# Altium footprint library PcbLib_jp.PcbLib: 255 footprints (part 9 of 16)
Each footprint in its own frame and in the unit in brackets; x right, y up, seen from the top. Pads: shape width x height; smd on the part's side, far side on the other; paste and mask are expansions set on the pad; w line width, h text height; cw(c..) or ccw(c..) is an arc to the next point about the centre after c.
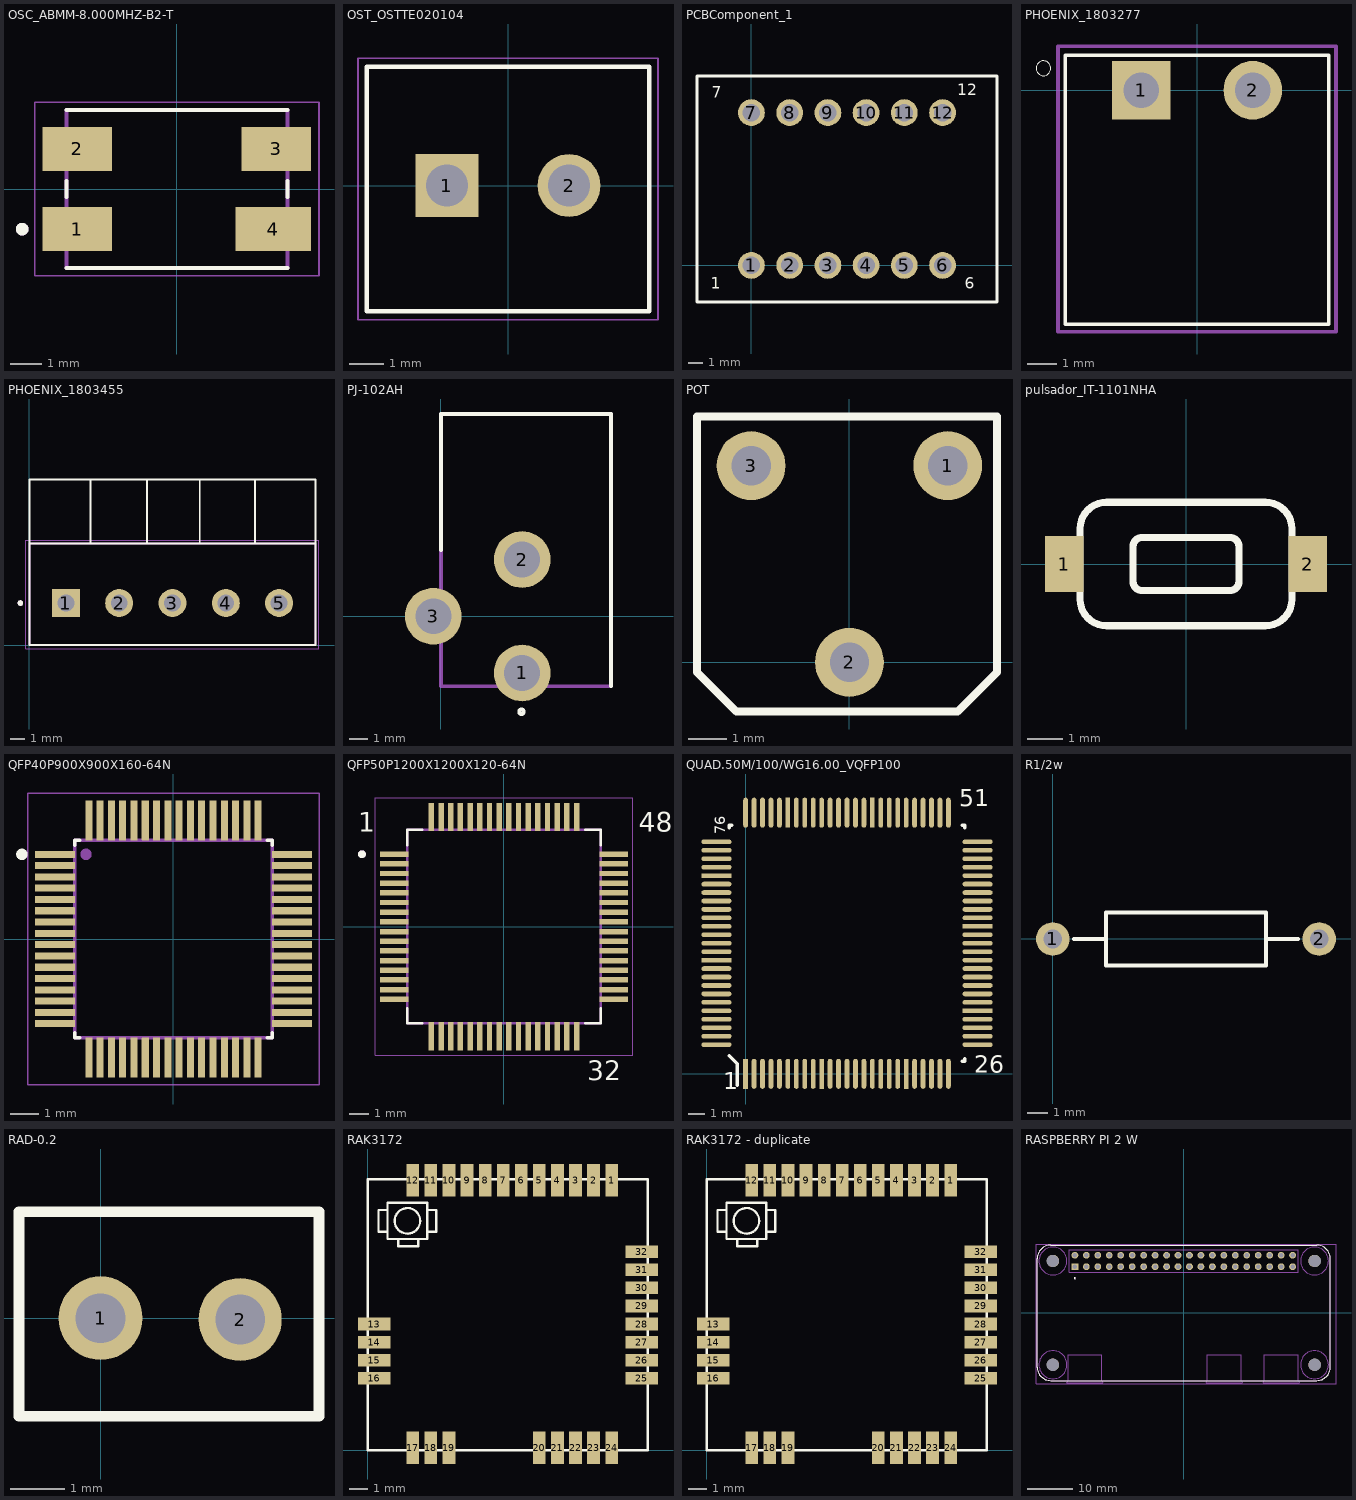
[diagram p8: the footprints below, top view; thin cyan lines are the x and y axes]

## OSC_ABMM-8.000MHZ-B2-T [mm]
pads (4):
  rect 2.2x1.4 smd: 1(-3.15,-1.27) 2(-3.15,1.27) 3(3.15,1.27)
  rect 2.4x1.4 smd: 4(3.05,-1.27)
Top Overlay:
  circle w0.2: c-4.9,-1.27 r0.1
  lines w0.127: -3.5,-2.5 3.5,-2.5 ; -3.5,-0.25 -3.5,0.25 ; -3.5,2.5 3.5,2.5 ; 3.5,-0.25 3.5,0.25
Mechanical 13:
  circle w0.2: c-4.9,-1.27 r0.1
  lines w0.127: -3.5,-2.5 -3.5,2.5 3.5,2.5 3.5,-2.5 -3.5,-2.5
Mechanical 15:
  lines w0.05: -4.5,-2.75 -4.5,2.75 4.5,2.75 4.5,-2.75 -4.5,-2.75
3D body "step_temp.STEP": height 1.3, standoff 0, extent -3.6,-2.6 3.6,2.6

## OST_OSTTE020104 [mm]
pads (2):
  rect 1.8x1.8 hole 1.2: 1(-1.75,0)
  round 1.8 hole 1.2: 2(1.75,0)
Top Overlay:
  lines w0.127: -4.05,-3.6 -4.05,3.4 4.05,3.4 4.05,-3.6 -4.05,-3.6
Mechanical 15:
  lines w0.05: -4.3,-3.85 -4.3,3.65 4.3,3.65 4.3,-3.85 -4.3,-3.85
3D body "OSTTE020104.step": height 8.4, standoff -3.8, extent -4.381,-3.429 3.619,3.571

## PCBComponent_1 [mm]
pads (12):
  round 1.824 hole 1.2: 1(0,0) 2(2.606,0) 3(5.212,0) 4(7.818,0) 5(10.424,0) 6(13.03,0) 7(0,10.414) 8(2.606,10.414) 9(5.212,10.414) 10(7.818,10.414) 11(10.424,10.414) 12(13.03,10.414)
Top Overlay:
  lines w0.2: -3.708,-2.489 -3.708,12.903 16.739,12.903 16.739,-2.489 -3.708,-2.489
  text "12" at 14.021,11.608 h0.76
  text "7" at -2.718,11.43 h0.76
  text "6" at 14.529,-1.6 h0.76
  text "1" at -2.769,-1.6 h0.76

## PHOENIX_1803277 [mm]
pads (2):
  rect 2x2 hole 1.2: 1(-1.905,0)
  round 2 hole 1.2: 2(1.905,0)
Top Overlay:
  circle w0: c-5.25,0.75 r0.254
  lines w0.127: -4.505,-8 4.505,-8 4.505,1.2 -4.505,1.2 -4.505,-8
Mechanical 15:
  lines w0.127: -4.75,-8.25 4.75,-8.25 4.75,1.5 -4.75,1.5 -4.75,-8.25
3D body "1803277.stp": height 7.25, standoff -3.4, extent -4.505,-8.05 4.505,1.25

## PHOENIX_1803455 [mm]
pads (5):
  rect 2x2 / inner round 1.8 / far side rect 1.8x1.8 hole 1.2: 1(2.6,3)
  round 2 hole 1.2: 2(6.41,3) 3(10.22,3) 4(14.03,3) 5(17.84,3)
Top Overlay:
  circle w0.2: c-0.65,3 r0.1
  lines w0.127: 0,7.297 0,11.83 20.43,11.83 20.43,7.297 ; 4.35,7.297 4.35,11.83 ; 8.4,7.297 8.4,11.83 ; 12.16,7.297 12.16,11.83 ; 16.12,7.297 16.12,11.83 ; 0,0 20.44,0 20.44,7.25 0,7.25 0,0
Mechanical 13:
  circle w0.2: c-0.65,3 r0.1
  lines w0.127: 0,0 20.44,0 20.44,7.25 0,7.25 0,0
Mechanical 15:
  lines w0.05: -0.25,-0.25 20.69,-0.25 20.69,7.5 -0.25,7.5 -0.25,-0.25
3D body "pxc_1803455_03_MCV-1-5-5-G-3-81_3D.stp": height 9.2, standoff -3.4, extent 0.03,0.01 20.471,7.26

## PJ-102AH [mm]
pads (3):
  round 3 hole 1.9: 1(4.3,-3) 2(4.3,3) 3(-0.4,0)
Top Overlay:
  circle w0.2: c4.261,-5.051 r0.119
  lines w0.2: 0,3.5 0,10.7 9,10.7 9,-3.7
Mechanical 13:
  lines w0.2: 0,-3.7 0,10.7 9,10.7 9,-3.7 0,-3.7
3D body "PJ-102BH.stp": height 11.26, standoff -3.24, extent -0.59,-3.69 8.81,10.71

## POT [mil]
pads (3):
  round 70 / inner round 60 / far side round 70 hole 40 mask+10: 1(100,200) 2(0,0) 3(-100,200)
Top Overlay:
  lines w8: -155,-10 -115,-50 110,-50 150,-10 150,250 -155,250 -155,-10

## pulsador_IT-1101NHA [mm]
height 3.9
pads (2):
  rect 1.1x1.6 smd: 1(-3.45,0) 2(3.45,0)
Top Overlay:
  lines w0.203: -2.25,1.75 ccw(c-2.25,1) -3,1 -3,-1 ccw(c-2.25,-1) -2.25,-1.75 2.25,-1.75 ccw(c2.25,-1) 3,-1 3,1 ccw(c2.25,1) 2.25,1.75 ; -2.25,1.75 2.25,1.75 ; -2.25,1.75 2.25,1.75 ; -1.5,-0.5 ccw(c-1.25,-0.5) -1.25,-0.75 1.25,-0.75 ccw(c1.25,-0.5) 1.5,-0.5 1.5,0.5 ccw(c1.25,0.5) 1.25,0.75 -1.25,0.75 ccw(c-1.25,0.5) -1.5,0.5 -1.5,-0.5
3D body "User Library-TVBU19.step": height 2.5, standoff 0, extent -3.05,-1.85 3.05,1.85

## QFP40P900X900X160-64N [mm]
pads (64):
  rrect6% 1.41x0.25 smd: 1(-4.2,3) 2(-4.2,2.6) 3(-4.2,2.2) 4(-4.2,1.8) 5(-4.2,1.4) 6(-4.2,1) 7(-4.2,0.6) 8(-4.2,0.2) 9(-4.2,-0.2) 10(-4.2,-0.6) 11(-4.2,-1) 12(-4.2,-1.4) 13(-4.2,-1.8) 14(-4.2,-2.2) 15(-4.2,-2.6) 16(-4.2,-3) 33(4.2,-3) 34(4.2,-2.6) 35(4.2,-2.2) 36(4.2,-1.8) 37(4.2,-1.4) 38(4.2,-1) 39(4.2,-0.6) 40(4.2,-0.2) 41(4.2,0.2) 42(4.2,0.6) 43(4.2,1) 44(4.2,1.4) 45(4.2,1.8) 46(4.2,2.2) 47(4.2,2.6) 48(4.2,3)
  rrect6% 0.25x1.41 smd: 17(-3,-4.2) 18(-2.6,-4.2) 19(-2.2,-4.2) 20(-1.8,-4.2) 21(-1.4,-4.2) 22(-1,-4.2) 23(-0.6,-4.2) 24(-0.2,-4.2) 25(0.2,-4.2) 26(0.6,-4.2) 27(1,-4.2) 28(1.4,-4.2) 29(1.8,-4.2) 30(2.2,-4.2) 31(2.6,-4.2) 32(3,-4.2) 49(3,4.2) 50(2.6,4.2) 51(2.2,4.2) 52(1.8,4.2) 53(1.4,4.2) 54(1,4.2) 55(0.6,4.2) 56(0.2,4.2) 57(-0.2,4.2) 58(-0.6,4.2) 59(-1,4.2) 60(-1.4,4.2) 61(-1.8,4.2) 62(-2.2,4.2) 63(-2.6,4.2) 64(-3,4.2)
Top Overlay:
  circle w0.2: c-5.373,3 r0.1
  lines w0.127: -3.5,-3.328 -3.5,-3.5 -3.328,-3.5 ; -3.5,3.328 -3.5,3.5 -3.328,3.5 ; 3.328,-3.5 3.5,-3.5 3.5,-3.328 ; 3.328,3.5 3.5,3.5 3.5,3.328
Mechanical 13:
  circle w0.2: c-3.099,3 r0.1
  lines w0.127: -3.5,-3.5 -3.5,3.5 3.5,3.5 3.5,-3.5 -3.5,-3.5
Mechanical 15:
  lines w0.05: -5.155,-5.155 -5.155,5.155 5.155,5.155 5.155,-5.155 -5.155,-5.155

## QFP50P1200X1200X120-64N [mm]
pads (64):
  rect 1.47x0.28 smd: 1(-5.67,3.75) 2(-5.67,3.25) 3(-5.67,2.75) 4(-5.67,2.25) 5(-5.67,1.75) 6(-5.67,1.25) 7(-5.67,0.75) 8(-5.67,0.25) 9(-5.67,-0.25) 10(-5.67,-0.75) 11(-5.67,-1.25) 12(-5.67,-1.75) 13(-5.67,-2.25) 14(-5.67,-2.75) 15(-5.67,-3.25) 16(-5.67,-3.75) 33(5.67,-3.75) 34(5.67,-3.25) 35(5.67,-2.75) 36(5.67,-2.25) 37(5.67,-1.75) 38(5.67,-1.25) 39(5.67,-0.75) 40(5.67,-0.25) 41(5.67,0.25) 42(5.67,0.75) 43(5.67,1.25) 44(5.67,1.75) 45(5.67,2.25) 46(5.67,2.75) 47(5.67,3.25) 48(5.67,3.75)
  rect 0.28x1.47 smd: 17(-3.75,-5.67) 18(-3.25,-5.67) 19(-2.75,-5.67) 20(-2.25,-5.67) 21(-1.75,-5.67) 22(-1.25,-5.67) 23(-0.75,-5.67) 24(-0.25,-5.67) 25(0.25,-5.67) 26(0.75,-5.67) 27(1.25,-5.67) 28(1.75,-5.67) 29(2.25,-5.67) 30(2.75,-5.67) 31(3.25,-5.67) 32(3.75,-5.67) 49(3.75,5.67) 50(3.25,5.67) 51(2.75,5.67) 52(2.25,5.67) 53(1.75,5.67) 54(1.25,5.67) 55(0.75,5.67) 56(0.25,5.67) 57(-0.25,5.67) 58(-0.75,5.67) 59(-1.25,5.67) 60(-1.75,5.67) 61(-2.25,5.67) 62(-2.75,5.67) 63(-3.25,5.67) 64(-3.75,5.67)
Top Overlay:
  circle w0.2: c-7.34,3.75 r0.1
  lines w0.127: -5,-4.21 -5,-5 -4.21,-5 ; -5,4.21 -5,5 -4.21,5 ; 4.21,-5 5,-5 5,-4.21 ; 4.21,5 5,5 5,4.21
  text "48" at 6.96,4.902 h1
  text "32" at 4.293,-7.925 h1
  text "1" at -7.544,4.902 h1
Mechanical 13:
  circle w0.2: c-7.34,3.75 r0.1
  circle w0.2: c-7.34,3.75 r0.1
  lines w0.127: -5,-5 5,-5 ; -5,-5 -5,5 ; -5,-5 5,-5 ; -5,-5 -5,5 ; -5,5 5,5 ; -5,5 5,5 ; 5,-5 5,5 ; 5,-5 5,5
Mechanical 15:
  lines w0.05: -6.655,-6.655 6.655,-6.655 6.655,6.655 -6.655,6.655 -6.655,-6.655
3D body "User Library-TQFP64-2.STEP": height 0.55, standoff -0.65, extent -6.049,-6.151 6.151,6.049

## QUAD.50M/100/WG16.00_VQFP100 [mil]
height 137.8
pads (100):
  rect 11x70 smd: 1(0,0) 10(177.3,0) 20(374.3,0) 60(295.5,608.8) 70(98.5,608.8)
  oval 11x70 smd: 2(19.7,0) 3(39.4,0) 4(59.1,0) 5(78.8,0) 6(98.5,0) 7(118.2,0) 8(137.9,0) 9(157.6,0) 11(197,0) 12(216.7,0) 13(236.4,0) 14(256.1,0) 15(275.8,0) 16(295.5,0) 17(315.2,0) 18(334.9,0) 19(354.6,0) 21(394,0) 22(413.7,0) 23(433.4,0) 24(453.1,0) 25(472.8,0) 51(472.8,608.8) 52(453.1,608.8) 53(433.4,608.8) 54(413.7,608.8) 55(394,608.8) 56(374.3,608.8) 57(354.6,608.8) 58(334.9,608.8) 59(315.2,608.8) 61(275.8,608.8) 62(256.1,608.8) 63(236.4,608.8) 64(216.7,608.8) 65(197,608.8) 66(177.3,608.8) 67(157.6,608.8) 68(137.9,608.8) 69(118.2,608.8) 71(78.8,608.8) 72(59.1,608.8) 73(39.4,608.8) 74(19.7,608.8) 75(0,608.8)
  oval 70x11 smd: 26(540.8,68) 27(540.8,87.7) 28(540.8,107.4) 29(540.8,127.1) 31(540.8,166.5) 32(540.8,186.2) 33(540.8,205.9) 34(540.8,225.6) 35(540.8,245.3) 36(540.8,265) 37(540.8,284.7) 38(540.8,304.4) 39(540.8,324.1) 41(540.8,363.5) 42(540.8,383.2) 43(540.8,402.9) 44(540.8,422.6) 45(540.8,442.3) 46(540.8,462) 47(540.8,481.7) 48(540.8,501.4) 49(540.8,521.1) 50(540.8,540.8) 76(-68,540.8) 77(-68,521.1) 78(-68,501.4) 79(-68,481.7) 81(-68,442.3) 82(-68,422.6) 83(-68,402.9) 84(-68,383.2) 85(-68,363.5) 86(-68,343.8) 87(-68,324.1) 88(-68,304.4) 89(-68,284.7) 91(-68,245.3) 92(-68,225.6) 93(-68,205.9) 94(-68,186.2) 95(-68,166.5) 96(-68,146.8) 97(-68,127.1) 98(-68,107.4) 99(-68,87.7) 100(-68,68)
  rect 70x11 smd: 30(540.8,146.8) 40(540.8,343.8) 80(-68,462) 90(-68,265)
Top Overlay:
  lines w8: -38.6,41.9 -38.5,41.9 -19.8,23.2 -19.8,-26.8 ; -38.6,573.2 -38.6,579.4 -32.3,579.4 ; 505.2,29.4 511.4,29.4 511.4,35.7 ; 505.2,579.4 511.4,579.4 511.4,573.2
  text "1" at -52.17,-35.43 h40
  text "26" at 533,2 h40
  text "51" at 498,624 h40
  text "76" at -47,559 h25
3D body "User Library-LQFP100_05.STEP": height 62.99, standoff 0, extent -78.74,-11.81 551.18,618.11

## R1/2w [mm] "Axial Device, Thru-Hole; 2 Leads; 0.5 in Pin Spacing"
height 2.54
pads (2):
  round 1.6 hole 0.9: 1(0,0) 2(12.7,0)
Top Overlay:
  lines w0.2: 1.016,0 2.54,0 ; 10.16,0 11.684,0 ; 2.54,-1.27 2.54,1.27 10.16,1.27 10.16,-1.27 2.54,-1.27
3D body "70398111.stp": height 2.1, standoff -0.1, extent 3.526,-1.108 9.326,1.092

## RAD-0.2 [mil] "Radial Cap, Thru-Hole; 2 Leads; 0.2 in Pin Spacing"
pads (2):
  round 60.63 hole 35.98: 1(0,0)
  round 60 hole 35.98: 2(101,-1)
Top Overlay:
  lines w7.87: 158,76 158,-71 -59,-71 -59,77 158,77
3D body "User Library-Jumper SL2.STEP": height 452.76, standoff -23.62, extent -53.42,-51 143.43,49

## RAK3172 [mm]
pads (32):
  rect 0.7x1.8 smd: 1(13.5,14.945) 2(12.5,14.945) 3(11.5,14.945) 4(10.5,14.945) 5(9.5,14.945) 6(8.5,14.945) 7(7.5,14.945) 8(6.5,14.945) 9(5.5,14.945) 10(4.5,14.945) 11(3.5,14.945) 12(2.5,14.945) 17(2.5,0.145) 18(3.5,0.145) 19(4.5,0.145) 20(9.5,0.145) 21(10.5,0.145) 22(11.5,0.145) 23(12.5,0.145) 24(13.5,0.145)
  rect 1.8x0.7 smd: 13(0.365,6.99) 14(0.365,5.99) 15(0.365,4.99) 16(0.365,3.99) 25(15.165,3.99) 26(15.165,4.99) 27(15.165,5.99) 28(15.165,6.99) 29(15.165,7.99) 30(15.165,8.99) 31(15.165,9.99) 32(15.165,10.99)
Top Overlay:
  circle w0.127: c2.2,12.7 r0.707
  lines w0.127: 1.1,12.1 1.1,11.7 1.7,11.7 ; 1.1,12.1 1.1,13.3 ; 1.1,12.1 0.6,12.1 0.6,13.3 1.1,13.3 ; 1.1,13.3 1.1,13.7 3.3,13.7 3.3,13.3 ; 1.7,11.7 1.7,11.3 2.8,11.3 2.8,11.7 ; 1.7,11.7 2.8,11.7 ; 2.8,11.7 3.3,11.7 3.3,12.1 ; 3.3,12.1 3.8,12.1 3.8,13.3 3.3,13.3 ; 3.3,12.1 3.3,13.3 ; 0,0 0,15 15.5,15 15.5,0 0,0
3D body "step_temp.STEP": height 4.5, standoff 0.99, extent 0.08,0.07 15.58,15.07

## RAK3172 - duplicate [mm]
pads (32):
  rect 0.7x1.8 smd: 1(13.5,14.945) 2(12.5,14.945) 3(11.5,14.945) 4(10.5,14.945) 5(9.5,14.945) 6(8.5,14.945) 7(7.5,14.945) 8(6.5,14.945) 9(5.5,14.945) 10(4.5,14.945) 11(3.5,14.945) 12(2.5,14.945) 17(2.5,0.145) 18(3.5,0.145) 19(4.5,0.145) 20(9.5,0.145) 21(10.5,0.145) 22(11.5,0.145) 23(12.5,0.145) 24(13.5,0.145)
  rect 1.8x0.7 smd: 13(0.365,6.99) 14(0.365,5.99) 15(0.365,4.99) 16(0.365,3.99) 25(15.165,3.99) 26(15.165,4.99) 27(15.165,5.99) 28(15.165,6.99) 29(15.165,7.99) 30(15.165,8.99) 31(15.165,9.99) 32(15.165,10.99)
Top Overlay:
  circle w0.127: c2.2,12.7 r0.707
  lines w0.127: 1.1,12.1 0.6,12.1 0.6,13.3 1.1,13.3 ; 1.1,12.1 1.1,13.3 ; 1.1,12.1 1.1,11.7 1.7,11.7 ; 1.1,13.3 1.1,13.7 3.3,13.7 3.3,13.3 ; 1.7,11.7 2.8,11.7 ; 1.7,11.7 1.7,11.3 2.8,11.3 2.8,11.7 ; 2.8,11.7 3.3,11.7 3.3,12.1 ; 3.3,12.1 3.3,13.3 ; 3.3,12.1 3.8,12.1 3.8,13.3 3.3,13.3 ; 0,0 15.5,0 15.5,15 0,15 0,0
3D body "step_temp.STEP": height 2.5, standoff -1.01, extent -0.254,0.49 15.246,15.49

## RASPBERRY PI 2 W [mm]
pads (44):
  rect 1.508x1.508 / inner round 1.508 / far side rect 1.508x1.508 hole 1: 1(-24.13,10.23)
  round 1.508 hole 1: 2(-24.13,12.77) 3(-21.59,10.23) 4(-21.59,12.77) 5(-19.05,10.23) 6(-19.05,12.77) 7(-16.51,10.23) 8(-16.51,12.77) 9(-13.97,10.23) 10(-13.97,12.77) 11(-11.43,10.23) 12(-11.43,12.77) 13(-8.89,10.23) 14(-8.89,12.77) 15(-6.35,10.23) 16(-6.35,12.77) 17(-3.81,10.23) 18(-3.81,12.77) 19(-1.27,10.23) 20(-1.27,12.77) 21(1.27,10.23) 22(1.27,12.77) 23(3.81,10.23) 24(3.81,12.77) 25(6.35,10.23) 26(6.35,12.77) 27(8.89,10.23) 28(8.89,12.77) 29(11.43,10.23) 30(11.43,12.77) 31(13.97,10.23) 32(13.97,12.77) 33(16.51,10.23) 34(16.51,12.77) 35(19.05,10.23) 36(19.05,12.77) 37(21.59,10.23) 38(21.59,12.77) 39(24.13,10.23) 40(24.13,12.77)
  round 2.75 hole 2.75 unplated: ""(-29,-11.5) ""(-29,11.5) ""(29,-11.5) ""(29,11.5)
Top Overlay:
  circle w0.2: c-24.13,7.69 r0.1
  lines w0.127: 4.4,-15 12.75,-15 ; 17,-15 25.35,-15 ; -32.5,-12 ccw(c-29.5,-12) -29.5,-15 29.5,-15 ccw(c29.5,-12) 32.5,-12 32.5,12 ccw(c29.5,12) 29.5,15 -29.5,15 ccw(c-29.5,12) -32.5,12 -32.5,-12
Mechanical 13:
  circle w0.127: c-29,-11.5 r3.1
  circle w0.127: c29,-11.5 r3.1
  circle w0.127: c29,11.5 r3.1
  circle w0.127: c-29,11.5 r3.1
  circle w0.2: c-24.13,7.69 r0.1
  lines w0.127: 4.4,-15 5.25,-15 ; 17,-15 17.85,-15 ; -25.65,-15 -29.5,-15 cw(c-29.5,-12) -32.5,-12 -32.5,12 cw(c-29.5,12) -29.5,15 29.5,15 cw(c29.5,12) 32.5,12 32.5,-12 cw(c29.5,-12) 29.5,-15 -18.15,-15 ; -25.65,-15 -18.15,-15 ; -25.65,-15 -25.65,-9.25 -18.15,-9.25 -18.15,-15 ; -25.65,-15 -25.9,-15.5 -17.9,-15.5 -18.15,-15 ; 5.25,-15 12.75,-15 ; 5.25,-15 5.25,-9.25 12.75,-9.25 12.75,-15 ; 5.25,-15 5,-15.5 13,-15.5 12.75,-15 ; 17.85,-15 25.35,-15 ; 17.85,-15 17.85,-9.25 25.35,-9.25 25.35,-15 ; 17.85,-15 17.6,-15.5 25.6,-15.5 25.35,-15 ; -25.4,8.96 -25.4,14.04 25.4,14.04 25.4,8.96 -25.4,8.96
Mechanical 15:
  lines w0.05: -32.75,-15.75 33.75,-15.75 33.75,15.25 -32.75,15.25 -32.75,-15.75
3D body "step_temp.STEP": height 8.63, standoff -2.29, extent -32.5,-16 33.5,15